# Altium schematic symbol library Wurth_Elektronik_Passive_rev16a.SCHLIB: 1143 symbols (part 8 of 27) (continued)
## WE-LHMI_4020
designator L?, comment <b>SMD Low Profile High Current Molded Inductor / <br> / <br> / <br><b> Characteristics / <br> / <br></b></b> Compact design / <br> / <br> Magnetically shielded / <br> / <br> High current capability / <br> / <br> Handles high transient current spikes / <br> / <br> No acoustic noise and no leakage field / <br> / <br> Frequency range up to 5 MHz / <br> / <br> Operating temperature: –40 °C to +125 °C / <br> / <Br> / <br><b>Applications / <br> / <br></b> DC/DC converters for high current power supplies / <br> / <br> DC/DC converters for Field Programmable Gate Array (FPGA) / <br> / <br> POL converters / <br> / <br> Portable power like PDA, digital cameras / <br> / <br> Mainboards/graphic cards / <br> / <br> Battery powered devices / <br> / <br> / <br><a href=http://katalog.we-online.de/media/images/eisos/IndLHMI_pf2.jpg" title="Enlarge picture"> / <img src="http://katalog.we-online.de/media/images/eisos/IndLHMI_pf2.jpg" width="320"></a><p> / Details see: <a href="http://katalog.we-online.de/en/pbs/WE-LHMI?">http://katalog.we-online.de/en/pbs/WE-LHMI?</a><p> / Updated by  Dan Xu 2014-07-08<br> / 2014 (C) Wurth Elektronik
footprint WE-LHMI_4020
pins: 1, 2

## WE-LHMI_5020
designator L?, comment <b>SMD Low Profile High Current Molded Inductor / <br> / <br> / <br><b> Characteristics / <br> / <br></b></b> Compact design / <br> / <br> Magnetically shielded / <br> / <br> High current capability / <br> / <br> Handles high transient current spikes / <br> / <br> No acoustic noise and no leakage field / <br> / <br> Frequency range up to 5 MHz / <br> / <br> Operating temperature: –40 °C to +125 °C / <br> / <Br> / <br><b>Applications / <br> / <br></b> DC/DC converters for high current power supplies / <br> / <br> DC/DC converters for Field Programmable Gate Array (FPGA) / <br> / <br> POL converters / <br> / <br> Portable power like PDA, digital cameras / <br> / <br> Mainboards/graphic cards / <br> / <br> Battery powered devices / <br> / <br> / <br><a href=http://katalog.we-online.de/media/images/eisos/IndLHMI_pf2.jpg" title="Enlarge picture"> / <img src="http://katalog.we-online.de/media/images/eisos/IndLHMI_pf2.jpg" width="320"></a><p> / Details see: <a href="http://katalog.we-online.de/en/pbs/WE-LHMI?">http://katalog.we-online.de/en/pbs/WE-LHMI?</a><p> / Updated by  Dan Xu 2014-07-08<br> / 2014 (C) Wurth Elektronik
footprint WE-LHMI_5020
pins: 1, 2

## WE-LHMI_5030
designator L?, comment <b>SMD Low Profile High Current Molded Inductor / <br> / <br> / <br><b> Characteristics / <br> / <br></b></b> Compact design / <br> / <br> Magnetically shielded / <br> / <br> High current capability / <br> / <br> Handles high transient current spikes / <br> / <br> No acoustic noise and no leakage field / <br> / <br> Frequency range up to 5 MHz / <br> / <br> Operating temperature: –40 °C to +125 °C / <br> / <Br> / <br><b>Applications / <br> / <br></b> DC/DC converters for high current power supplies / <br> / <br> DC/DC converters for Field Programmable Gate Array (FPGA) / <br> / <br> POL converters / <br> / <br> Portable power like PDA, digital cameras / <br> / <br> Mainboards/graphic cards / <br> / <br> Battery powered devices / <br> / <br> / <br><a href=http://katalog.we-online.de/media/images/eisos/IndLHMI_pf2.jpg" title="Enlarge picture"> / <img src="http://katalog.we-online.de/media/images/eisos/IndLHMI_pf2.jpg" width="320"></a><p> / Details see: <a href="http://katalog.we-online.de/en/pbs/WE-LHMI?">http://katalog.we-online.de/en/pbs/WE-LHMI?</a><p> / Updated by  Dan Xu 2014-07-08<br> / 2014 (C) Wurth Elektronik
footprint WE-LHMI_5030
pins: 1, 2

## WE-LHMI_7030/7050
designator L?, comment <b>SMD Low Profile High Current Molded Inductor / <br> / <br> / <br><b> Characteristics / <br> / <br></b></b> Compact design / <br> / <br> Magnetically shielded / <br> / <br> High current capability / <br> / <br> Handles high transient current spikes / <br> / <br> No acoustic noise and no leakage field / <br> / <br> Frequency range up to 5 MHz / <br> / <br> Operating temperature: –40 °C to +125 °C / <br> / <Br> / <br><b>Applications / <br> / <br></b> DC/DC converters for high current power supplies / <br> / <br> DC/DC converters for Field Programmable Gate Array (FPGA) / <br> / <br> POL converters / <br> / <br> Portable power like PDA, digital cameras / <br> / <br> Mainboards/graphic cards / <br> / <br> Battery powered devices / <br> / <br> / <br><a href=http://katalog.we-online.de/media/images/eisos/IndLHMI_pf2.jpg" title="Enlarge picture"> / <img src="http://katalog.we-online.de/media/images/eisos/IndLHMI_pf2.jpg" width="320"></a><p> / Details see: <a href="http://katalog.we-online.de/en/pbs/WE-LHMI?">http://katalog.we-online.de/en/pbs/WE-LHMI?</a><p> / Updated by  Dan Xu 2014-07-08<br> / 2014 (C) Wurth Elektronik
footprint WE-LHMI_7030/7050
pins: 1, 2

## WE-LHMI_8030
designator L?, comment <b>SMD Low Profile High Current Molded Inductor / <br> / <br> / <br><b> Characteristics / <br> / <br></b></b> Compact design / <br> / <br> Magnetically shielded / <br> / <br> High current capability / <br> / <br> Handles high transient current spikes / <br> / <br> No acoustic noise and no leakage field / <br> / <br> Frequency range up to 5 MHz / <br> / <br> Operating temperature: –40 °C to +125 °C / <br> / <Br> / <br><b>Applications / <br> / <br></b> DC/DC converters for high current power supplies / <br> / <br> DC/DC converters for Field Programmable Gate Array (FPGA) / <br> / <br> POL converters / <br> / <br> Portable power like PDA, digital cameras / <br> / <br> Mainboards/graphic cards / <br> / <br> Battery powered devices / <br> / <br> / <br><a href=http://katalog.we-online.de/media/images/eisos/IndLHMI_pf2.jpg" title="Enlarge picture"> / <img src="http://katalog.we-online.de/media/images/eisos/IndLHMI_pf2.jpg" width="320"></a><p> / Details see: <a href="http://katalog.we-online.de/en/pbs/WE-LHMI?">http://katalog.we-online.de/en/pbs/WE-LHMI?</a><p> / Updated by  Dan Xu 2014-07-08<br> / 2014 (C) Wurth Elektronik
footprint WE-LHMI_8030
pins: 1, 2

## WE-LHMI_8040
designator L?, comment <b>SMD Low Profile High Current Molded Inductor / <br> / <br> / <br><b> Characteristics / <br> / <br></b></b> Compact design / <br> / <br> Magnetically shielded / <br> / <br> High current capability / <br> / <br> Handles high transient current spikes / <br> / <br> No acoustic noise and no leakage field / <br> / <br> Frequency range up to 5 MHz / <br> / <br> Operating temperature: –40 °C to +125 °C / <br> / <Br> / <br><b>Applications / <br> / <br></b> DC/DC converters for high current power supplies / <br> / <br> DC/DC converters for Field Programmable Gate Array (FPGA) / <br> / <br> POL converters / <br> / <br> Portable power like PDA, digital cameras / <br> / <br> Mainboards/graphic cards / <br> / <br> Battery powered devices / <br> / <br> / <br><a href=http://katalog.we-online.de/media/images/eisos/IndLHMI_pf2.jpg" title="Enlarge picture"> / <img src="http://katalog.we-online.de/media/images/eisos/IndLHMI_pf2.jpg" width="320"></a><p> / Details see: <a href="http://katalog.we-online.de/en/pbs/WE-LHMI?">http://katalog.we-online.de/en/pbs/WE-LHMI?</a><p> / Updated by  Dan Xu 2014-07-08<br> / 2014 (C) Wurth Elektronik
footprint WE-LHMI_8040
pins: 1, 2

## WE-LHMI_8040(R22/R33/R47)
designator L?, comment <b>SMD Low Profile High Current Molded Inductor / <br> / <br> / <br><b> Characteristics / <br> / <br></b></b> Compact design / <br> / <br> Magnetically shielded / <br> / <br> High current capability / <br> / <br> Handles high transient current spikes / <br> / <br> No acoustic noise and no leakage field / <br> / <br> Frequency range up to 5 MHz / <br> / <br> Operating temperature: –40 °C to +125 °C / <br> / <Br> / <br><b>Applications / <br> / <br></b> DC/DC converters for high current power supplies / <br> / <br> DC/DC converters for Field Programmable Gate Array (FPGA) / <br> / <br> POL converters / <br> / <br> Portable power like PDA, digital cameras / <br> / <br> Mainboards/graphic cards / <br> / <br> Battery powered devices / <br> / <br> / <br><a href=http://katalog.we-online.de/media/images/eisos/IndLHMI_pf2.jpg" title="Enlarge picture"> / <img src="http://katalog.we-online.de/media/images/eisos/IndLHMI_pf2.jpg" width="320"></a><p> / Details see: <a href="http://katalog.we-online.de/en/pbs/WE-LHMI?">http://katalog.we-online.de/en/pbs/WE-LHMI?</a><p> / Updated by  Dan Xu 2014-07-08<br> / 2014 (C) Wurth Elektronik
footprint WE-LHMI_8040_R22/R33/R47
pins: 1, 2

## WE-LLCR_760895631
designator L?, comment <b>Characteristics / <br> / <br> / <br><b> Characteristics / <br> / <br></b></b> Transformer for high efficiency power supply / <br> / <br> Input voltage 360–400 VDC / <br> / <br> Switching frequency 70–120 kHz / <br> / <br> Output power 150 W–250 W / <br> / <br> Testing voltage 4 kVAC / <br> / <br> Litz wire for low eddy current losses / <br> / <br> Defined leakage inductance for use without additional resonant inductor / <br> / <br> / <br><b> Applications / <br> / <br></b> Power supplies for PC, netbook, LED lighting and other power supplies / <br> / <br> High efficient resonant converters / <br> / <br> / <br> / <br><a href="http://katalog.we-online.de/media/images/eisos/UtLLCR_pf2.jpg" title="Enlarge picture"> / <img src="http://katalog.we-online.de/media/images/eisos/UtLLCR_pf2.jpg" width="320"></a><p> / Details see: <a href="http://katalog.we-online.de/en/pbs/WE-LLCR?">http://katalog.we-online.de/en/pbs/WE-LLCR?</a><p> / Updated  by  Dan Xu 2014-07-07<br> / 2014 (C) Wurth Elektronik
footprint WE-LLCR_ETD39
pins: 2 8, 4 1, 5 7, 6, 8 9 2, 10 4, 11 12 3, 13 14 5

## WE-LLCR_760895641
designator L?, comment <b>Characteristics / <br> / <br> / <br><b> Characteristics / <br> / <br></b></b> Transformer for high efficiency power supply / <br> / <br> Input voltage 360–400 VDC / <br> / <br> Switching frequency 70–120 kHz / <br> / <br> Output power 150 W–250 W / <br> / <br> Testing voltage 4 kVAC / <br> / <br> Litz wire for low eddy current losses / <br> / <br> Defined leakage inductance for use without additional resonant inductor / <br> / <br> / <br><b> Applications / <br> / <br></b> Power supplies for PC, netbook, LED lighting and other power supplies / <br> / <br> High efficient resonant converters / <br> / <br> / <br> / <br><a href="http://katalog.we-online.de/media/images/eisos/UtLLCR_pf2.jpg" title="Enlarge picture"> / <img src="http://katalog.we-online.de/media/images/eisos/UtLLCR_pf2.jpg" width="320"></a><p> / Details see: <a href="http://katalog.we-online.de/en/pbs/WE-LLCR?">http://katalog.we-online.de/en/pbs/WE-LLCR?</a><p> / Updated  by  Dan Xu 2014-07-07<br> / 2014 (C) Wurth Elektronik
footprint WE-LLCR_ETD39
pins: 2 8, 4 1, 5 7, 6, 8 2, 10 4, 12 3, 14 5

## WE-LLCR_760895651
designator L?, comment <b>Characteristics / <br> / <br> / <br><b> Characteristics / <br> / <br></b></b> Transformer for high efficiency power supply / <br> / <br> Input voltage 360–400 VDC / <br> / <br> Switching frequency 70–120 kHz / <br> / <br> Output power 150 W–250 W / <br> / <br> Testing voltage 4 kVAC / <br> / <br> Litz wire for low eddy current losses / <br> / <br> Defined leakage inductance for use without additional resonant inductor / <br> / <br> / <br><b> Applications / <br> / <br></b> Power supplies for PC, netbook, LED lighting and other power supplies / <br> / <br> High efficient resonant converters / <br> / <br> / <br> / <br><a href="http://katalog.we-online.de/media/images/eisos/UtLLCR_pf2.jpg" title="Enlarge picture"> / <img src="http://katalog.we-online.de/media/images/eisos/UtLLCR_pf2.jpg" width="320"></a><p> / Details see: <a href="http://katalog.we-online.de/en/pbs/WE-LLCR?">http://katalog.we-online.de/en/pbs/WE-LLCR?</a><p> / Updated  by  Dan Xu 2014-07-07<br> / 2014 (C) Wurth Elektronik
footprint WE-LLCR_ETD39
pins: 2 8, 4 1, 5 7, 6, 8 2, 10 4, 12 3, 14 5

## WE-LLCR_ETD34
designator L?, comment <b>Characteristics / <br> / <br> / <br><b> Characteristics / <br> / <br></b></b> Transformer for high efficiency power supply / <br> / <br> Input voltage 360–400 VDC / <br> / <br> Switching frequency 70–120 kHz / <br> / <br> Output power 150 W–250 W / <br> / <br> Testing voltage 4 kVAC / <br> / <br> Litz wire for low eddy current losses / <br> / <br> Defined leakage inductance for use without additional resonant inductor / <br> / <br> / <br><b> Applications / <br> / <br></b> Power supplies for PC, netbook, LED lighting and other power supplies / <br> / <br> High efficient resonant converters / <br> / <br> / <br> / <br><a href="http://katalog.we-online.de/media/images/eisos/UtLLCR_pf2.jpg" title="Enlarge picture"> / <img src="http://katalog.we-online.de/media/images/eisos/UtLLCR_pf2.jpg" width="320"></a><p> / Details see: <a href="http://katalog.we-online.de/en/pbs/WE-LLCR?">http://katalog.we-online.de/en/pbs/WE-LLCR?</a><p> / Updated  by  Dan Xu 2014-07-07<br> / 2014 (C) Wurth Elektronik
footprint WE-LLCR_ETD34
pins: 2 8, 4 1, 5 7, 6, 8 2, 9 4, 10 3, 11 5

## WE-LLCR_ETD44
designator L?, comment <b>Characteristics / <br> / <br> / <br><b> Characteristics / <br> / <br></b></b> Transformer for high efficiency power supply / <br> / <br> Input voltage 360–400 VDC / <br> / <br> Switching frequency 70–120 kHz / <br> / <br> Output power 150 W–250 W / <br> / <br> Testing voltage 4 kVAC / <br> / <br> Litz wire for low eddy current losses / <br> / <br> Defined leakage inductance for use without additional resonant inductor / <br> / <br> / <br><b> Applications / <br> / <br></b> Power supplies for PC, netbook, LED lighting and other power supplies / <br> / <br> High efficient resonant converters / <br> / <br> / <br> / <br><a href="http://katalog.we-online.de/media/images/eisos/UtLLCR_pf2.jpg" title="Enlarge picture"> / <img src="http://katalog.we-online.de/media/images/eisos/UtLLCR_pf2.jpg" width="320"></a><p> / Details see: <a href="http://katalog.we-online.de/en/pbs/WE-LLCR?">http://katalog.we-online.de/en/pbs/WE-LLCR?</a><p> / Updated  by  Dan Xu 2014-07-07<br> / 2014 (C) Wurth Elektronik
footprint WE-LLCR_ETD44
pins: 1 2 2, 3 4 4, 5 6 3, 7 8 5, 10 8, 12 1, 14 6, 15 7

## WE-LPF_0603
designator LPF?, comment <b>Multilayer Chip Low-Pass Filter / <br> / <br> / <br><b> Characteristics / <br> / <br></b></b> Operating temperature: –40 °C to +85 °C / <br> / <br> Power capacity up to 3 W / <br> / <br> Low insertion loss and high attenuation in the stop-band / <br> / <br> / <br><b>Applications / <br> / <br></b> RF applications / <br> / <br> Wireless communication systems like DECT, PACS, PHS, GSM, WLAN, Bluetooth … / <br> / <br> / <br><a href="http://katalog.we-online.de/media/images/eisos/RfLPF_pf2.jpg" title="Enlarge picture"> / <img src="http://katalog.we-online.de/media/images/eisos/RfLPF_pf2.jpg" width="320"></a><p> / Details see: <a href="http://katalog.we-online.de/en/pbs/WE-LPF?">http://katalog.we-online.de/en/pbs/WE-LPF?</a><p> / Updated  by  Dan Xu 2014-07-08<br> / 2014 (C) Wurth Elektronik
footprint WE-LPF_0603
pins: 1, 2, 3, 4, 5, 6

## WE-LPF_0805
designator LPF?, comment <b>Multilayer Chip Low-Pass Filter / <br> / <br> / <br><b> Characteristics / <br> / <br></b></b> Operating temperature: –40 °C to +85 °C / <br> / <br> Power capacity up to 3 W / <br> / <br> Low insertion loss and high attenuation in the stop-band / <br> / <br> / <br><b>Applications / <br> / <br></b> RF applications / <br> / <br> Wireless communication systems like DECT, PACS, PHS, GSM, WLAN, Bluetooth … / <br> / <br> / <br><a href="http://katalog.we-online.de/media/images/eisos/RfLPF_pf2.jpg" title="Enlarge picture"> / <img src="http://katalog.we-online.de/media/images/eisos/RfLPF_pf2.jpg" width="320"></a><p> / Details see: <a href="http://katalog.we-online.de/en/pbs/WE-LPF?">http://katalog.we-online.de/en/pbs/WE-LPF?</a><p> / Updated  by  Dan Xu 2014-07-08<br> / 2014 (C) Wurth Elektronik
footprint WE-LPF_0805
pins: 1 GND (power), 2 NC, 3 GND (power), 4 OUT (out), 5 GND (power), 6 NC, 7 GND (power), 8 IN

## WE-LQ_1210
designator L?, comment <b>SMD Inductor / <br> / <br> / <br><b> Characteristics / <br> / <br></b></b> Miniature chip inductor wound on a special ferrite core / <br> / <br> Small inductances for compact circuits / <br> / <br> High Q at high frequencies / <br> / <br> Low DC-resistance / <br> / <br> Operating temperature: –40 ºC to +125 ºC / <br> / <br> / <br><b> Applications / <br> / <br></b>  Low power DC/DC-converters from Linear Technology, National Semiconductor, Texas Instruments, Fairchild Semiconductor, ON Semiconductor, STMicroelectronics, Maxim, MPS, Semtech, Exar, Analogic Tech, Diodes and Cologne Chip / <br> / <br> EMI-Filtering / <br> / <br> RF-circuits / <br> / <br> / <br> / <br><a href="http://katalog.we-online.de/media/images/eisos/IndLQ_pf2.jpg" title="Enlarge picture"> / <img src="http://katalog.we-online.de/media/images/eisos/IndLQ_pf2.jpg" width="320"></a><p> / Details see: <a href="http://katalog.we-online.de/en/pbs/WE-LQ?">http://katalog.we-online.de/en/pbs/WE-LQ?</a><p> / Updated  by  Dan Xu 2014-07-08<br> / 2014 (C) Wurth Elektronik
footprint WE-LQ_M
pins: 1, 2

## WE-LQ_1812
designator L?, comment <b>SMD Inductor / <br> / <br> / <br><b> Characteristics / <br> / <br></b></b> Miniature chip inductor wound on a special ferrite core / <br> / <br> Small inductances for compact circuits / <br> / <br> High Q at high frequencies / <br> / <br> Low DC-resistance / <br> / <br> Operating temperature: –40 ºC to +125 ºC / <br> / <br> / <br><b> Applications / <br> / <br></b>  Low power DC/DC-converters from Linear Technology, National Semiconductor, Texas Instruments, Fairchild Semiconductor, ON Semiconductor, STMicroelectronics, Maxim, MPS, Semtech, Exar, Analogic Tech, Diodes and Cologne Chip / <br> / <br> EMI-Filtering / <br> / <br> RF-circuits / <br> / <br> / <br> / <br><a href="http://katalog.we-online.de/media/images/eisos/IndLQ_pf2.jpg" title="Enlarge picture"> / <img src="http://katalog.we-online.de/media/images/eisos/IndLQ_pf2.jpg" width="320"></a><p> / Details see: <a href="http://katalog.we-online.de/en/pbs/WE-LQ?">http://katalog.we-online.de/en/pbs/WE-LQ?</a><p> / Updated  by  Dan Xu 2014-07-08<br> / 2014 (C) Wurth Elektronik
footprint WE-LQ_L
pins: 1, 2

## WE-LQS_2512
designator L?, comment <b>SMD Shielded Tiny Power Inductor / <br> / <br> / <br><b> Characteristics / <br> / <br></b></b> Tiny Power Inductor design / <br> / <br> 1.7 times more current in comparison with unshielded versions / <br> / <br> Robust design & high durability / <br> / <br> Low RDC / <br> / <br> Magnetically shielded with magnetic glue reducing buzz noise in ultra-low levels / <br> / <br> Operating Temperature: –40 °C to +125 °C / <br> / <br> / <br><b> Applications / <br> / <br></b> Integrated DC/DC Converters / <br> / <br> Switching controllers which required high efficiency / <br> / <br> Portable power (Smartphones, digital cameras, Tablets, etc.) / <br> / <br> Embedded laptops and PCs / <br> / <br> Big sizes (5040, 60xx, 8040) used for shock-proof circuits / <br> / <br> / <br> / <br><a href="http://katalog.we-online.de/media/images/eisos/IndLQS_pf2.jpg" title="Enlarge picture"> / <img src="http://katalog.we-online.de/media/thumbs2/eisos/thb_IndLQS_pf2.jpg" width="320"></a><p> / Details see: <a href="http://katalog.we-online.de/en/pbs/WE-LQS">http://katalog.we-online.de/en/pbs/WE-LQS</a><p> / Created  by  Dan Xu 2014-05-21<br> / 2014 (C) Wurth Elektronik
footprint WE-LQS_2512
pins: 1, 2

## WE-LQS_3012
designator L?, comment <b>SMD Shielded Tiny Power Inductor / <br> / <br> / <br><b> Characteristics / <br> / <br></b></b> Tiny Power Inductor design / <br> / <br> 1.7 times more current in comparison with unshielded versions / <br> / <br> Robust design & high durability / <br> / <br> Low RDC / <br> / <br> Magnetically shielded with magnetic glue reducing buzz noise in ultra-low levels / <br> / <br> Operating Temperature: –40 °C to +125 °C / <br> / <br> / <br><b> Applications / <br> / <br></b> Integrated DC/DC Converters / <br> / <br> Switching controllers which required high efficiency / <br> / <br> Portable power (Smartphones, digital cameras, Tablets, etc.) / <br> / <br> Embedded laptops and PCs / <br> / <br> Big sizes (5040, 60xx, 8040) used for shock-proof circuits / <br> / <br> / <br> / <br><a href="http://katalog.we-online.de/media/images/eisos/IndLQS_pf2.jpg" title="Enlarge picture"> / <img src="http://katalog.we-online.de/media/thumbs2/eisos/thb_IndLQS_pf2.jpg" width="320"></a><p> / Details see: <a href="http://katalog.we-online.de/en/pbs/WE-LQS">http://katalog.we-online.de/en/pbs/WE-LQS</a><p> / Created  by  Dan Xu 2014-05-21<br> / 2014 (C) Wurth Elektronik
footprint WE-LQS_3012
pins: 1, 2

## WE-LQS_3015
designator L?, comment <b>SMD Shielded Tiny Power Inductor / <br> / <br> / <br><b> Characteristics / <br> / <br></b></b> Tiny Power Inductor design / <br> / <br> 1.7 times more current in comparison with unshielded versions / <br> / <br> Robust design & high durability / <br> / <br> Low RDC / <br> / <br> Magnetically shielded with magnetic glue reducing buzz noise in ultra-low levels / <br> / <br> Operating Temperature: –40 °C to +125 °C / <br> / <br> / <br><b> Applications / <br> / <br></b> Integrated DC/DC Converters / <br> / <br> Switching controllers which required high efficiency / <br> / <br> Portable power (Smartphones, digital cameras, Tablets, etc.) / <br> / <br> Embedded laptops and PCs / <br> / <br> Big sizes (5040, 60xx, 8040) used for shock-proof circuits / <br> / <br> / <br> / <br><a href="http://katalog.we-online.de/media/images/eisos/IndLQS_pf2.jpg" title="Enlarge picture"> / <img src="http://katalog.we-online.de/media/thumbs2/eisos/thb_IndLQS_pf2.jpg" width="320"></a><p> / Details see: <a href="http://katalog.we-online.de/en/pbs/WE-LQS">http://katalog.we-online.de/en/pbs/WE-LQS</a><p> / Created  by  Dan Xu 2014-05-21<br> / 2014 (C) Wurth Elektronik
footprint WE-LQS_3015
pins: 1, 2

## WE-LQS_4012
designator L?, comment <b>SMD Shielded Tiny Power Inductor / <br> / <br> / <br><b> Characteristics / <br> / <br></b></b> Tiny Power Inductor design / <br> / <br> 1.7 times more current in comparison with unshielded versions / <br> / <br> Robust design & high durability / <br> / <br> Low RDC / <br> / <br> Magnetically shielded with magnetic glue reducing buzz noise in ultra-low levels / <br> / <br> Operating Temperature: –40 °C to +125 °C / <br> / <br> / <br><b> Applications / <br> / <br></b> Integrated DC/DC Converters / <br> / <br> Switching controllers which required high efficiency / <br> / <br> Portable power (Smartphones, digital cameras, Tablets, etc.) / <br> / <br> Embedded laptops and PCs / <br> / <br> Big sizes (5040, 60xx, 8040) used for shock-proof circuits / <br> / <br> / <br> / <br><a href="http://katalog.we-online.de/media/images/eisos/IndLQS_pf2.jpg" title="Enlarge picture"> / <img src="http://katalog.we-online.de/media/thumbs2/eisos/thb_IndLQS_pf2.jpg" width="320"></a><p> / Details see: <a href="http://katalog.we-online.de/en/pbs/WE-LQS">http://katalog.we-online.de/en/pbs/WE-LQS</a><p> / Created  by  Dan Xu 2014-05-21<br> / 2014 (C) Wurth Elektronik
footprint WE-LQS_4012
pins: 1, 2

## WE-LQS_4018
designator L?, comment <b>SMD Shielded Tiny Power Inductor / <br> / <br> / <br><b> Characteristics / <br> / <br></b></b> Tiny Power Inductor design / <br> / <br> 1.7 times more current in comparison with unshielded versions / <br> / <br> Robust design & high durability / <br> / <br> Low RDC / <br> / <br> Magnetically shielded with magnetic glue reducing buzz noise in ultra-low levels / <br> / <br> Operating Temperature: –40 °C to +125 °C / <br> / <br> / <br><b> Applications / <br> / <br></b> Integrated DC/DC Converters / <br> / <br> Switching controllers which required high efficiency / <br> / <br> Portable power (Smartphones, digital cameras, Tablets, etc.) / <br> / <br> Embedded laptops and PCs / <br> / <br> Big sizes (5040, 60xx, 8040) used for shock-proof circuits / <br> / <br> / <br> / <br><a href="http://katalog.we-online.de/media/images/eisos/IndLQS_pf2.jpg" title="Enlarge picture"> / <img src="http://katalog.we-online.de/media/thumbs2/eisos/thb_IndLQS_pf2.jpg" width="320"></a><p> / Details see: <a href="http://katalog.we-online.de/en/pbs/WE-LQS">http://katalog.we-online.de/en/pbs/WE-LQS</a><p> / Created  by  Dan Xu 2014-05-21<br> / 2014 (C) Wurth Elektronik
footprint WE-LQS_4018
pins: 1, 2

## WE-LQS_5020
designator L?, comment <b>SMD Shielded Tiny Power Inductor / <br> / <br> / <br><b> Characteristics / <br> / <br></b></b> Tiny Power Inductor design / <br> / <br> 1.7 times more current in comparison with unshielded versions / <br> / <br> Robust design & high durability / <br> / <br> Low RDC / <br> / <br> Magnetically shielded with magnetic glue reducing buzz noise in ultra-low levels / <br> / <br> Operating Temperature: –40 °C to +125 °C / <br> / <br> / <br><b> Applications / <br> / <br></b> Integrated DC/DC Converters / <br> / <br> Switching controllers which required high efficiency / <br> / <br> Portable power (Smartphones, digital cameras, Tablets, etc.) / <br> / <br> Embedded laptops and PCs / <br> / <br> Big sizes (5040, 60xx, 8040) used for shock-proof circuits / <br> / <br> / <br> / <br><a href="http://katalog.we-online.de/media/images/eisos/IndLQS_pf2.jpg" title="Enlarge picture"> / <img src="http://katalog.we-online.de/media/thumbs2/eisos/thb_IndLQS_pf2.jpg" width="320"></a><p> / Details see: <a href="http://katalog.we-online.de/en/pbs/WE-LQS">http://katalog.we-online.de/en/pbs/WE-LQS</a><p> / Created  by  Dan Xu 2014-05-21<br> / 2014 (C) Wurth Elektronik
footprint WE-LQS_5020
pins: 1, 2

## WE-LQS_5040
designator L?, comment <b>SMD Shielded Tiny Power Inductor / <br> / <br> / <br><b> Characteristics / <br> / <br></b></b> Tiny Power Inductor design / <br> / <br> 1.7 times more current in comparison with unshielded versions / <br> / <br> Robust design & high durability / <br> / <br> Low RDC / <br> / <br> Magnetically shielded with magnetic glue reducing buzz noise in ultra-low levels / <br> / <br> Operating Temperature: –40 °C to +125 °C / <br> / <br> / <br><b> Applications / <br> / <br></b> Integrated DC/DC Converters / <br> / <br> Switching controllers which required high efficiency / <br> / <br> Portable power (Smartphones, digital cameras, Tablets, etc.) / <br> / <br> Embedded laptops and PCs / <br> / <br> Big sizes (5040, 60xx, 8040) used for shock-proof circuits / <br> / <br> / <br> / <br><a href="http://katalog.we-online.de/media/images/eisos/IndLQS_pf2.jpg" title="Enlarge picture"> / <img src="http://katalog.we-online.de/media/thumbs2/eisos/thb_IndLQS_pf2.jpg" width="320"></a><p> / Details see: <a href="http://katalog.we-online.de/en/pbs/WE-LQS">http://katalog.we-online.de/en/pbs/WE-LQS</a><p> / Created  by  Dan Xu 2014-05-21<br> / 2014 (C) Wurth Elektronik
footprint WE-LQS_5040
pins: 1, 2

## WE-LQS_6028
designator L?, comment <b>SMD Shielded Tiny Power Inductor / <br> / <br> / <br><b> Characteristics / <br> / <br></b></b> Tiny Power Inductor design / <br> / <br> 1.7 times more current in comparison with unshielded versions / <br> / <br> Robust design & high durability / <br> / <br> Low RDC / <br> / <br> Magnetically shielded with magnetic glue reducing buzz noise in ultra-low levels / <br> / <br> Operating Temperature: –40 °C to +125 °C / <br> / <br> / <br><b> Applications / <br> / <br></b> Integrated DC/DC Converters / <br> / <br> Switching controllers which required high efficiency / <br> / <br> Portable power (Smartphones, digital cameras, Tablets, etc.) / <br> / <br> Embedded laptops and PCs / <br> / <br> Big sizes (5040, 60xx, 8040) used for shock-proof circuits / <br> / <br> / <br> / <br><a href="http://katalog.we-online.de/media/images/eisos/IndLQS_pf2.jpg" title="Enlarge picture"> / <img src="http://katalog.we-online.de/media/thumbs2/eisos/thb_IndLQS_pf2.jpg" width="320"></a><p> / Details see: <a href="http://katalog.we-online.de/en/pbs/WE-LQS">http://katalog.we-online.de/en/pbs/WE-LQS</a><p> / Created  by  Dan Xu 2014-05-21<br> / 2014 (C) Wurth Elektronik
footprint WE-LQS_6028
pins: 1, 2

## WE-LQS_6045
designator L?, comment <b>SMD Shielded Tiny Power Inductor / <br> / <br> / <br><b> Characteristics / <br> / <br></b></b> Tiny Power Inductor design / <br> / <br> 1.7 times more current in comparison with unshielded versions / <br> / <br> Robust design & high durability / <br> / <br> Low RDC / <br> / <br> Magnetically shielded with magnetic glue reducing buzz noise in ultra-low levels / <br> / <br> Operating Temperature: –40 °C to +125 °C / <br> / <br> / <br><b> Applications / <br> / <br></b> Integrated DC/DC Converters / <br> / <br> Switching controllers which required high efficiency / <br> / <br> Portable power (Smartphones, digital cameras, Tablets, etc.) / <br> / <br> Embedded laptops and PCs / <br> / <br> Big sizes (5040, 60xx, 8040) used for shock-proof circuits / <br> / <br> / <br> / <br><a href="http://katalog.we-online.de/media/images/eisos/IndLQS_pf2.jpg" title="Enlarge picture"> / <img src="http://katalog.we-online.de/media/thumbs2/eisos/thb_IndLQS_pf2.jpg" width="320"></a><p> / Details see: <a href="http://katalog.we-online.de/en/pbs/WE-LQS">http://katalog.we-online.de/en/pbs/WE-LQS</a><p> / Created  by  Dan Xu 2014-05-21<br> / 2014 (C) Wurth Elektronik
footprint WE-LQS_6045
pins: 1, 2

## WE-LQS_8040
designator L?, comment <b>SMD Shielded Tiny Power Inductor / <br> / <br> / <br><b> Characteristics / <br> / <br></b></b> Tiny Power Inductor design / <br> / <br> 1.7 times more current in comparison with unshielded versions / <br> / <br> Robust design & high durability / <br> / <br> Low RDC / <br> / <br> Magnetically shielded with magnetic glue reducing buzz noise in ultra-low levels / <br> / <br> Operating Temperature: –40 °C to +125 °C / <br> / <br> / <br><b> Applications / <br> / <br></b> Integrated DC/DC Converters / <br> / <br> Switching controllers which required high efficiency / <br> / <br> Portable power (Smartphones, digital cameras, Tablets, etc.) / <br> / <br> Embedded laptops and PCs / <br> / <br> Big sizes (5040, 60xx, 8040) used for shock-proof circuits / <br> / <br> / <br> / <br><a href="http://katalog.we-online.de/media/images/eisos/IndLQS_pf2.jpg" title="Enlarge picture"> / <img src="http://katalog.we-online.de/media/thumbs2/eisos/thb_IndLQS_pf2.jpg" width="320"></a><p> / Details see: <a href="http://katalog.we-online.de/en/pbs/WE-LQS">http://katalog.we-online.de/en/pbs/WE-LQS</a><p> / Created  by  Dan Xu 2014-05-21<br> / 2014 (C) Wurth Elektronik
footprint WE-LQS_8040
pins: 1, 2

## WE-LQS_252012
designator L?, comment <b>SMD Shielded Tiny Power Inductor / <br> / <br> / <br><b> Characteristics / <br> / <br></b></b> Tiny Power Inductor design / <br> / <br> 1.7 times more current in comparison with unshielded versions / <br> / <br> Robust design & high durability / <br> / <br> Low RDC / <br> / <br> Magnetically shielded with magnetic glue reducing buzz noise in ultra-low levels / <br> / <br> Operating Temperature: –40 °C to +125 °C / <br> / <br> / <br><b> Applications / <br> / <br></b> Integrated DC/DC Converters / <br> / <br> Switching controllers which required high efficiency / <br> / <br> Portable power (Smartphones, digital cameras, Tablets, etc.) / <br> / <br> Embedded laptops and PCs / <br> / <br> Big sizes (5040, 60xx, 8040) used for shock-proof circuits / <br> / <br> / <br> / <br><a href="http://katalog.we-online.de/media/images/eisos/IndLQS_pf2.jpg" title="Enlarge picture"> / <img src="http://katalog.we-online.de/media/thumbs2/eisos/thb_IndLQS_pf2.jpg" width="320"></a><p> / Details see: <a href="http://katalog.we-online.de/en/pbs/WE-LQS">http://katalog.we-online.de/en/pbs/WE-LQS</a><p> / Created  by  Dan Xu 2014-05-21<br> / 2014 (C) Wurth Elektronik
footprint WE-LQS_252012
pins: 1, 2

## WE-MAIA_2506
designator L?, comment <b> WE-MAIA SMD Power Inductor / <br> / <br><b>Characteristics</B> / </b><br>Magnetic iron alloy allows high rated currents / <br>Compact design / <br>Magnetically shielded / <br>Hight current capability and handles hight transient current spikes / <br>No acoustic noise and no leakage flux noise / <br>Operating temperature range:-40°C up to 125°C / <br> / <br><b>Applications / </b><br>Power supplies for smartphones, tablet PCs and other mobile devices / <br>DC/DC-converter for high current power supplies / <br>DC/DC-converter for Field Programmable Gate Array (FPGA) / <br>POL-converters / <br>Portable power like PDA, digital camera / <br>Mainboards/graphic cards / <br>Battery powered devices / <br>Wireless communication devices / <br> / <br><a href="http://katalog.we-online.de/media/images/eisos/IndMAIA_pf2.jpg" title="Enlarge picture"> / <img src="http://katalog.we-online.de/media/thumbs2/eisos/thb_IndMAIA_pf2.jpg" width="320"></a><p> / Details see: <a href="http://katalog.we-online.de/en/pbs/WE-MAIA/">http://katalog.we-online.de/en/pbs/WE-MAIA/ / </a><p>Created: 2015-02-04 / <br>2015 (C) Wurth Elektronik
footprint WE-MAIA_2506
pins: 1, 2